# Altium footprint library 连接插件.PcbLib: 93 footprints (part 6 of 6)
Each footprint in its own frame and in the unit in brackets; x right, y up, seen from the top. Pads: shape width x height; smd on the part's side, far side on the other; paste and mask are expansions set on the pad; w line width, h text height; cw(c..) or ccw(c..) is an arc to the next point about the centre after c.
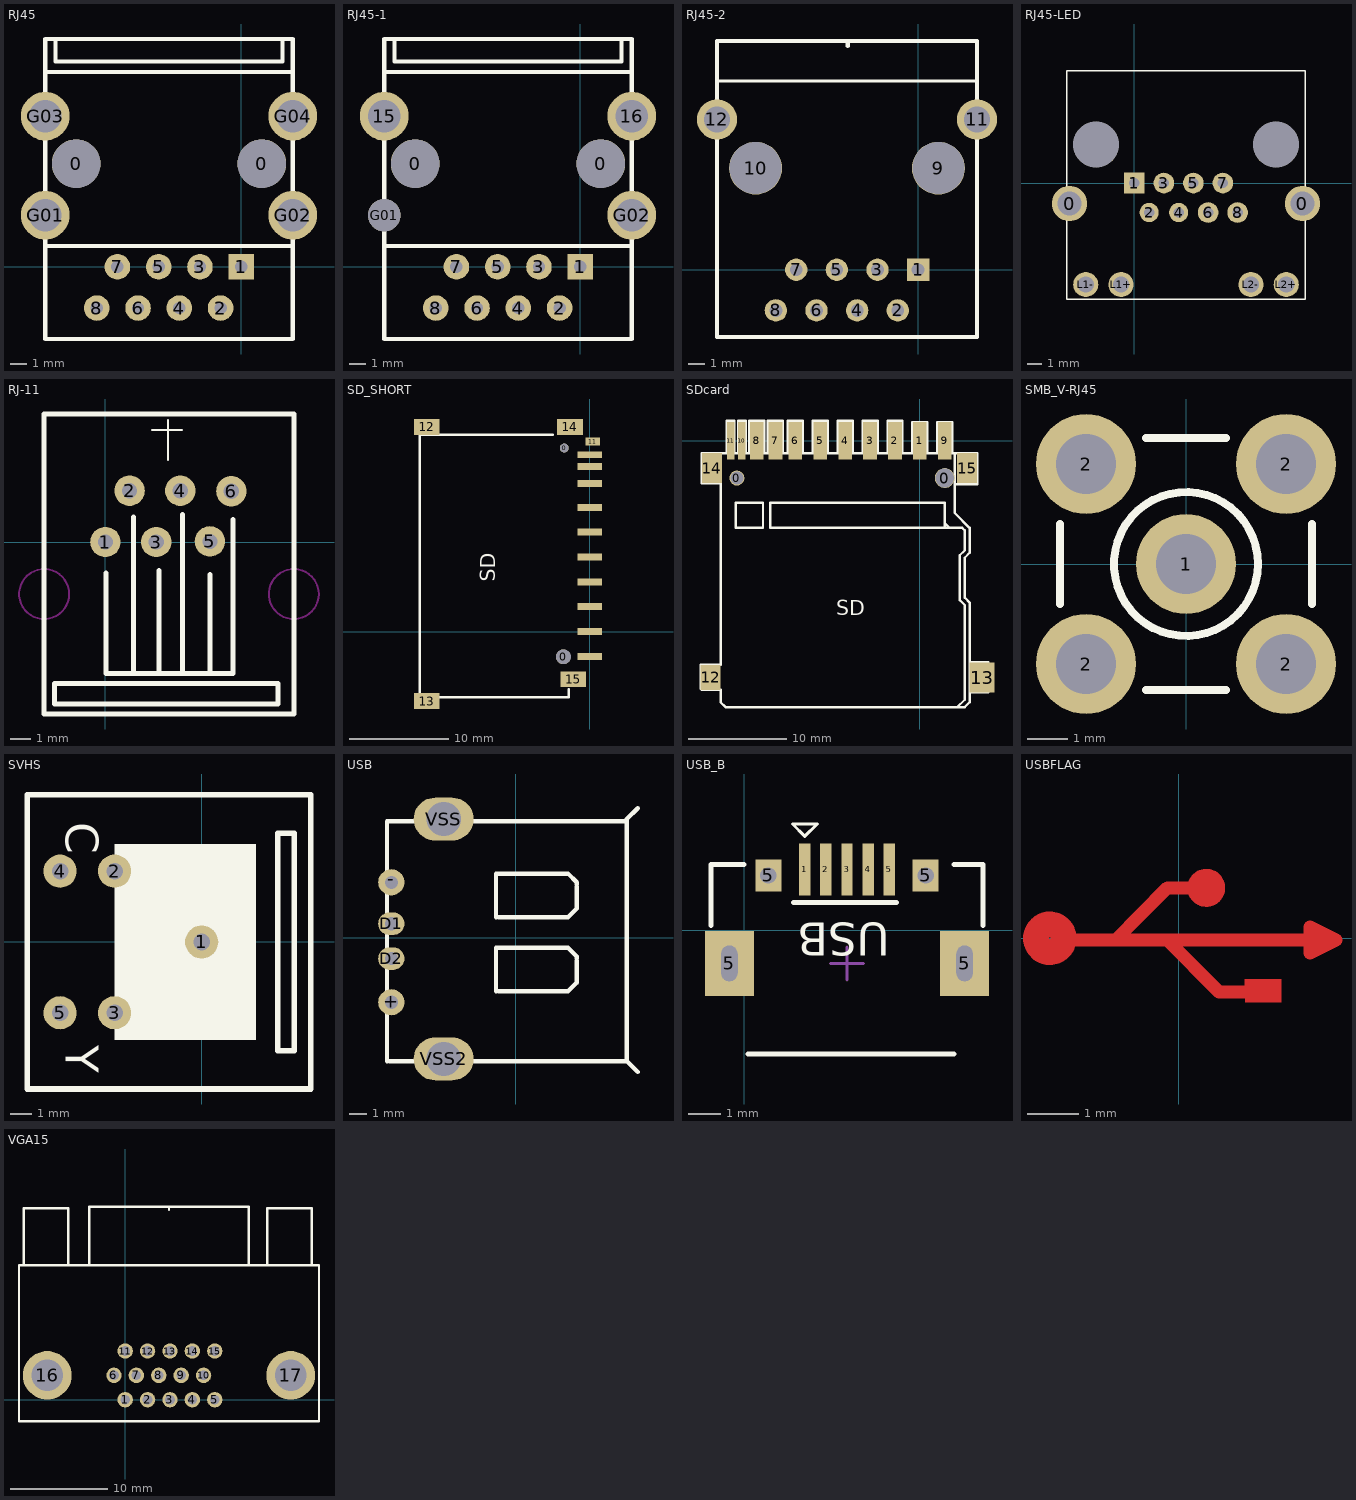
[diagram p5: the footprints below, top view; thin cyan lines are the x and y axes]

## RJ45 [mil]
pads (14):
  round 118.11 hole 118.11: 0(-400,250) 0(50,250)
  rect 62x62 hole 30: 1(0,0)
  round 62 hole 30: 2(-50,-100) 3(-100,0) 4(-150,-100) 5(-200,0) 6(-250,-100) 7(-300,0) 8(-350,-100)
  round 118.11 hole 78.74: G01(-475,125) G02(125,125) G03(-475,365) G04(125,365)
Top Overlay:
  lines w10: -475,50 125,50 ; -475,472.24 125,472.24 ; -450,547.24 -450,497.24 100,497.24 100,547.24 ; -475,-175 125,-175 125,500 125,552.18 -475,552.18 -475,500 -475,-175
3D body "RJ45-8P-Pipe-Cat6.step": height 572.83, standoff -141.73, extent -523,-293.44 169.91,651.44

## RJ45-1 [mil]
pads (14):
  round 118.11 hole 118.11: 0(-400,250) 0(50,250)
  rect 62x62 hole 30: 1(0,0)
  round 62 hole 30: 2(-50,-100) 3(-100,0) 4(-150,-100) 5(-200,0) 6(-250,-100) 7(-300,0) 8(-350,-100)
  round 118.11 hole 78.74: 15(-475,365) 16(125,365) G02(125,125)
  round 78.74 hole 78.74: G01(-475,125)
Top Overlay:
  lines w10: -475,50 125,50 ; -475,472.24 125,472.24 ; -450,547.24 -450,497.24 100,497.24 100,547.24 ; -475,-175 125,-175 125,500 125,552.18 -475,552.18 -475,500 -475,-175
3D body "RJ45-8P-Pipe-Cat6.step": height 572.83, standoff -141.73, extent -523,-293.44 169.91,651.44

## RJ45-2 [mil]
pads (12):
  rect 55x55 hole 31.5: 1(0,0)
  round 55 hole 31.5: 2(-50,-100) 3(-100,0) 4(-150,-100) 5(-200,0) 6(-250,-100) 7(-300,0) 8(-350,-100)
  round 130 hole 127.95 unplated: 9(50,250) 10(-400,250)
  round 98.42 hole 62.99: 11(145,370) 12(-495,370)
Top Overlay:
  lines w8: -488.19,464.57 141.73,464.57
  lines w10: -495,-165.35 144.65,-165.35 145,-165 145,370 145,562.99 -495,562.99 -495,370 -495,-165 ; -173.23,551.18 -173.23,559.06
3D body "Mod-Jack-K122449007-Stig-W.STEP": height 127.85, standoff -555.12, extent -490,-172.17 139.92,556.17

## RJ45-LED [mm]
pads (16):
  round 2.4 hole 1.6: 0(-4.4,-1.39) 0(11.4,-1.39)
  rect 1.4x1.4 hole 0.7: 1(0,0)
  round 1.3 hole 0.7: 2(1,-2) 4(3,-2)
  round 1.4 hole 0.7: 3(2,0) 5(4,0) 6(5,-2) 7(6,0) 8(7,-2)
  round 1.7 hole 1.1: L1+(-0.9,-6.89) L1-(-3.3,-6.89) L2+(10.3,-6.89) L2-(7.9,-6.89)
  round 3.1 hole 3.1: ""(-2.6,2.61) ""(9.6,2.61)
Top Overlay:
  lines w0.1: -4.6,-7.89 11.6,-7.89 11.6,7.61 -4.6,7.61 -4.6,-7.89

## RJ-11 [mil]
height 590.55
pads (6):
  round 60 hole 30: 1(0,0) 2(47.48,101.1) 3(100,0) 4(147.48,101.1) 5(205.67,1.1) 6(247.87,100)
Top Overlay:
  lines w3.94: 91.49,220.45 150.55,220.45 ; 122.99,161.39 122.99,220.45 ; 122.99,216.51 122.99,240.14
  lines w10: 1.42,-61.1 1.42,-258.58 251.42,-258.58 251.42,43.86 ; 55.35,-258.58 55.35,48.9 ; 105.35,-258.58 105.35,-56.06 ; 151.42,-258.58 151.42,54.25 ; 206.14,-258.58 206.14,-64.25 ; 367.08,-338.58 -120.63,-338.58 -120.63,251.97 371.5,251.97 ; 371.18,-338.58 371.18,251.97 ; -100.63,-318.58 339.37,-318.58 339.37,-278.58 -100.63,-278.58 -100.63,-318.58
Keep-Out Layer:
  circle w3.94: c-120.63,-102.52 r49.21
  circle w3.94: c370.86,-102.52 r49.21

## SD_SHORT [mm]
height 3
pads (17):
  round 1.5 hole 1.5: 0(-2.656,-2.54)
  round 0.9 hole 0.9 unplated: 0(-2.566,18.475)
  rect 2.5x0.7 smd: 1(0,0) 2(0,2.5) 3(0,5) 4(0,7.5) 5(0,10) 6(0,12.5) 7(0,14.925) 8(0,16.625) 9(0,-2.5) 10(0,17.8)
  rect 1.5x0.8 smd: 11(0.3,19.13)
  rect 2.6x1.6 smd: 12(-16.404,20.6) 13(-16.404,-7) 14(-1.988,20.6) 15(-1.664,-4.8)
Top Overlay:
  lines w0.254: -3.7,19.8 -17.1,19.8 -17.1,-6.6 -2.1,-6.6 -2.1,-5.8
  text "SD" at -9.5,5 h1.52

## SDcard [mil] "WWW.OURAVR.COM"
pads (17):
  round 60 hole 52: 0(-735,-150)
  round 80 hole 75: 0(100,-150)
  rect 55x150 smd: 1(0,0) 2(-100,0) 3(-200,0) 4(-300,0) 5(-400,0) 6(-500,0) 7(-580,0) 8(-655,0) 9(100,0)
  rect 30x150 smd: 10(-715,0) 11(-760,0)
  rect 80x100 smd: 12(-840,-950)
  rect 100x120 smd: 13(249.63,-950.84)
  rect 80x120 smd: 14(-835,-110) 15(190,-110)
Top Overlay:
  lines w10: -775,-50 -775,80 -745,80 -745,-50 -800,-50 -875,-50 -875,-170 -800,-170 -800,-900 -880,-900 -880,-995 -875,-1000 -800,-1000 -800,-1050 -780,-1070 -770,-1070 180,-1070 200,-1050 200,-650 180,-630 180,-470 200,-450 200,-440 200,-370 200,-350 140,-290 140,-60 140,-50 ; -750,-50 140,-50 ; -730,-50 -730,80 -700,80 -700,-50 ; -685,-45 -685,80 -625,80 -625,-45 ; -650,-350 -630,-350 -630,-250 -740,-250 -740,-350 -640,-350 ; -610,-45 -610,80 -550,80 -550,-45 ; -530,-45 -530,80 -470,80 -470,-45 ; -430,-45 -430,80 -370,80 -370,-45 ; -330,-45 -330,80 -270,80 -270,-45 ; -230,-45 -230,80 -170,80 -170,-45 ; -130,-45 -130,80 -70,80 -70,-45 ; -30,-50 -30,75 30,75 30,-50 ; 70,-50 70,75 130,75 130,-50 ; 100,-330 120,-350 ; 140,-175 230,-175 230,-50 140,-50 ; 150,-1070 180,-1040 180,-670 180,-660 160,-640 160,-460 180,-440 180,-360 170,-350 100,-350 ; 200,-1010 275,-1010 ; 200,-890 275,-890 ; 100,-350 -600,-350 -600,-250 100,-250 100,-340 100,-350
  text "SD" at -335,-700 h60

## SMB_V-RJ45 [mm] "Connector; SMB Straight"
pads (5):
  round 2.5 hole 1.5: 1(0,0) 2(-2.5,-2.5) 2(-2.5,2.5) 2(2.5,-2.5) 2(2.5,2.5)
Top Overlay:
  circle w0.2: c0,0 r1.8
  lines w0.2: -3.15,-1 -3.15,1 ; -1,-3.15 1,-3.15 ; -1,3.15 1,3.15 ; 3.15,-1 3.15,1
Mechanical 1:
  circle w0.025: c0,0 r0.2
  circle w0.025: c0,0 r1.05
  circle w0.025: c0,0 r1.8

## SVHS [mil] "S VIDEO PORT"
pads (5):
  round 60 hole 30: 1(0,0) 2(-157.48,127.95) 3(-157.48,-127.95) 4(-255.91,127.95) 5(-255.91,-127.95)
Top Overlay:
  rectangle: -157.48,-177.17 98.43,177.17
  lines w10: -314.96,-265.75 -314.96,265.75 196.85,265.75 196.85,-265.75 -314.96,-265.75 ; 137.8,-196.85 167.32,-196.85 167.32,196.85 137.8,196.85 137.8,-196.85
  text "Y" at -246.06,-187.01 h60
  text "C" at -246.06,216.54 h60
3D body "SVHS.STEP": height 767.72, standoff -59.06, extent -314.96,-255.9 118.11,255.91

## USB [mm]
pads (6):
  round 1.524 hole 0.762: +(-7.255,-3.757) -(-7.255,3.228)
  oval 1.524x1.324 hole 0.762: D1(-7.255,0.815) D2(-7.255,-1.217)
  oval 3.5x2.5 hole 2: VSS(-4.207,6.911) VSS2(-4.207,-7.059)
Top Overlay:
  lines w0.254: -7.509,-7.186 -7.509,6.784 6.461,6.784 ; -7.382,-7.186 6.461,-7.186 ; -1.159,-3.122 -1.159,-0.582 3.032,-0.582 3.54,-1.09 3.54,-1.217 ; -1.159,1.196 -1.159,3.736 3.032,3.736 3.54,3.228 3.54,3.101 ; -1.032,-3.122 3.032,-3.122 3.54,-2.614 3.54,-1.344 ; -1.032,1.196 3.032,1.196 3.54,1.704 3.54,2.974 ; 7.096,-7.821 6.461,-7.186 ; 7.096,7.546 6.461,6.911 6.461,6.784 ; 6.461,-7.186 6.461,6.784
3D body "USB-A DIP.STEP": height 6.95, standoff -4.2, extent -8.255,-8.154 5.445,7.646

## USB_B [mm]
pads (9):
  rect 0.35x1.6 smd: 1(1.875,1.884) 2(2.525,1.884) 3(3.175,1.884) 4(3.825,1.884) 5(4.475,1.884)
  rect 1.5x2 hole 0.5 slot 1.1 at 90 deg: 5(-0.45,-1.016) 5(6.8,-1.016)
  rect 0.8x1 hole 0.5: 5(0.75,1.694) 5(5.6,1.694)
Top Overlay:
  lines w0.1: 1.494,3.281 1.875,2.9 2.256,3.281 1.494,3.281
  lines w0.152: -1.016,0.152 -1.016,2.032 0,2.032 ; 0.127,-3.81 6.477,-3.81 ; 1.525,0.859 4.7,0.859 ; 6.477,2.032 7.366,2.032 7.366,0.152
  text "USB" at 4.496,0.23 h1.02
Mechanical 15:
  lines w0.1: 2.667,-1.016 3.683,-1.016 ; 3.175,-1.524 3.175,-0.508
3D body "USB micro_A.STEP": height 2.8, standoff -0.95, extent -0.826,-3.726 7.176,1.874

## USBFLAG [mm]
Top Layer:
  circle w0.25: c0.536,0.979 r0.244
  circle w0.5: c-2.5,0 r0.268
  rectangle: 1.29,-1.25 2,-0.792
  region: 
  region: 
  region: 1.29,-0.792 1.829,-0.792 1.829,-1.068 1.29,-1.068
  lines w0: 1.29,-1.068 1.829,-1.068 1.829,-0.792 1.29,-0.792 1.29,-1.068
  lines w0.252: -2.234,-0.033 2.802,-0.033 ; -1.227,-0.033 -0.22,0.979 0.536,0.979 ; -0.22,-0.033 0.788,-1.045 1.291,-1.045 ; 2.55,-0.286 3.054,-0.033 2.55,0.22
  lines w0.254: 2.55,-0.286 2.55,0.22

## VGA15 [mm]
pads (17):
  round 1.58 hole 1: 1(0,0) 2(2.3,0) 3(4.6,0) 4(6.9,0) 5(9.2,0) 6(-1.15,2.5) 7(1.15,2.5) 8(3.45,2.5) 9(5.75,2.5) 10(8.05,2.5) 11(0,5) 12(2.3,5) 13(4.6,5) 14(6.9,5) 15(9.2,5)
  round 5 hole 3.25: 16(-8,2.5) 17(17,2.5)
Top Overlay:
  lines w0.254: -10.9,-2.2 -10.9,13.8 19.9,13.8 19.9,-2.2 -10.89,-2.2 -10.9,-2.19 ; -10.4,13.8 -10.4,19.67 -5.83,19.67 -5.83,13.82 ; -3.7,13.8 -3.7,19.8 12.7,19.8 12.7,13.8 ; 4.5,19.5 4.5,19.8 ; 14.6,13.8 14.6,19.68 19.18,19.68 19.18,13.84
3D body "SW3dPS-Connector, D-Sub, 15 pin HD, RA, Receptacle.STEP": height 12.77, standoff -3.27, extent -11.055,-0.875 19.755,20.225